# Altium footprint library Integrated Circuits.PcbLib: 142 footprints (part 8 of 9)
Each footprint in its own frame and in the unit in brackets; x right, y up, seen from the top. Pads: shape width x height; smd on the part's side, far side on the other; paste and mask are expansions set on the pad; w line width, h text height; cw(c..) or ccw(c..) is an arc to the next point about the centre after c.
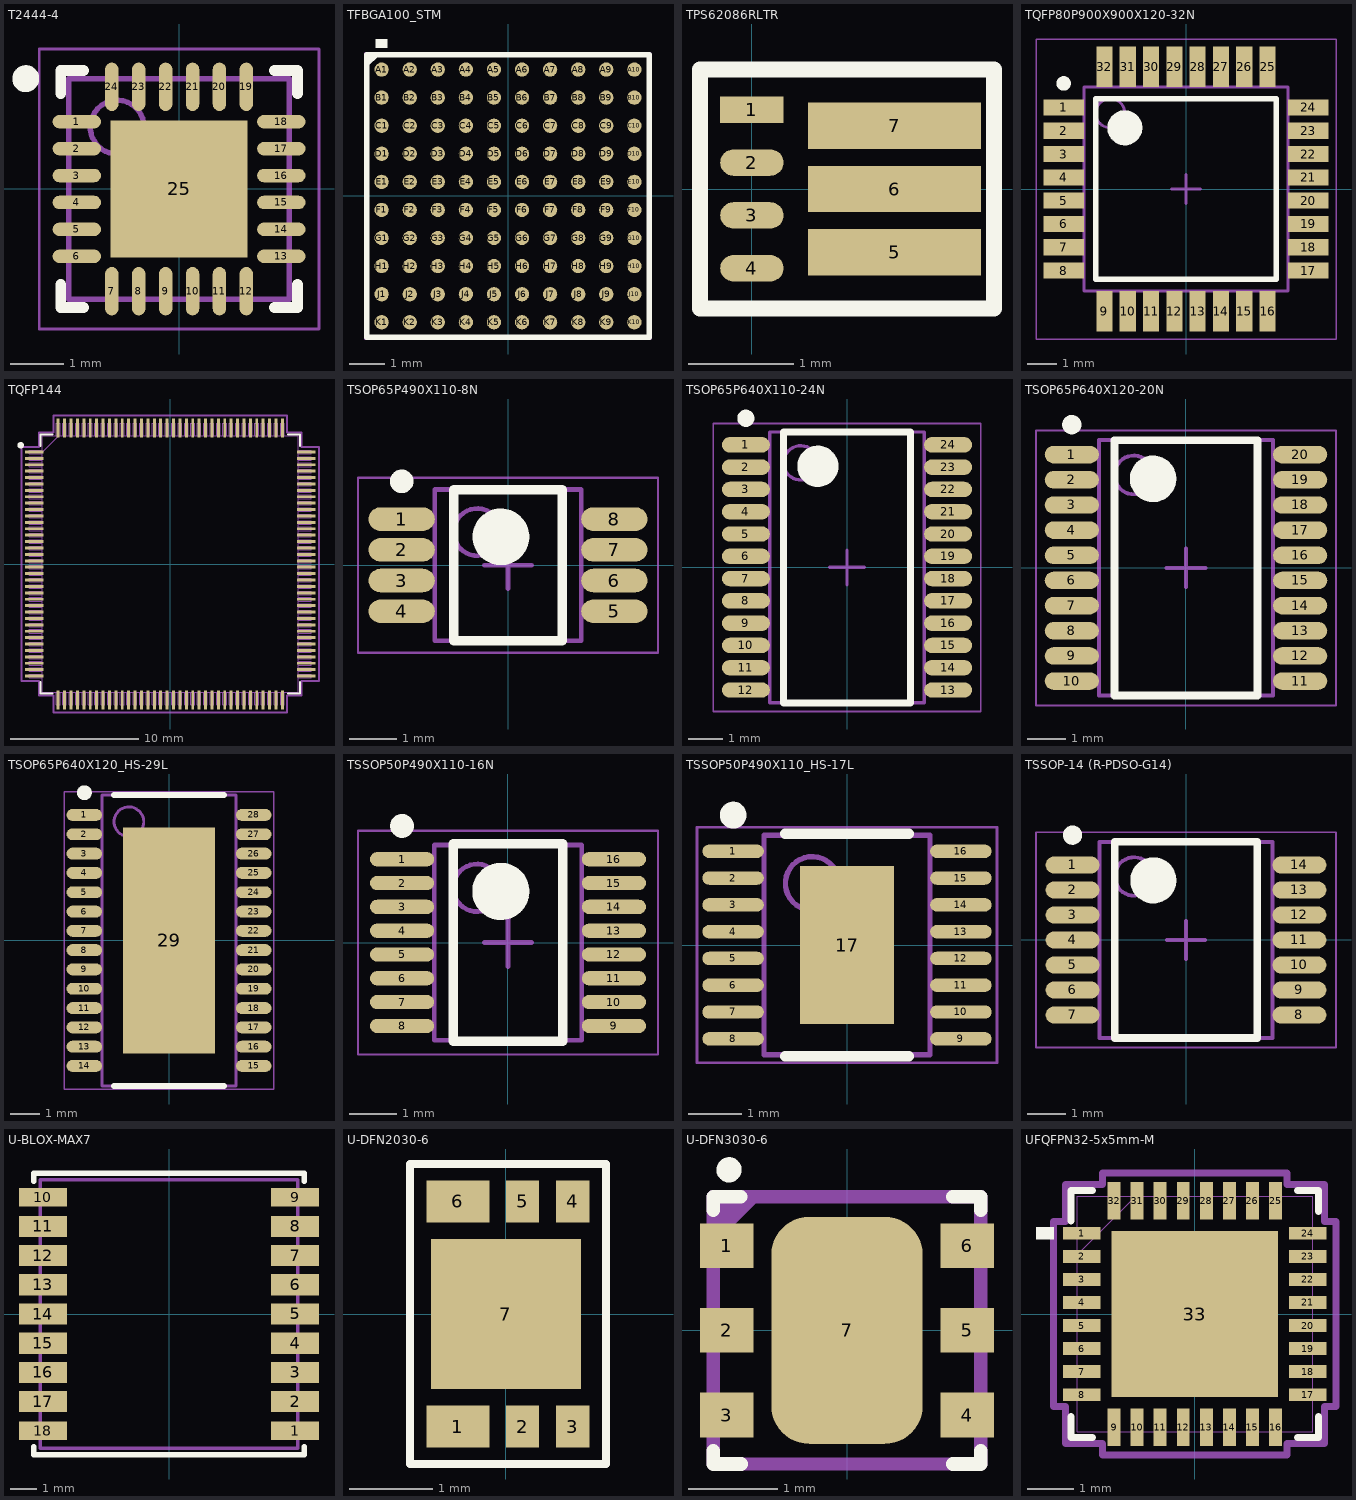
[diagram p7: the footprints below, top view; thin cyan lines are the x and y axes]

## T2444-4 [mm] "QFN, 24-Leads, Body 4.00x4.00mm, Pitch 0.50mm, Thermal Pad 2.54x2.54mm, IPC Medium Density"
height 0.8
pads (25):
  oval 0.9x0.25 smd mask+0.1: 1(-1.9,1.25) 2(-1.9,0.75) 3(-1.9,0.25) 4(-1.9,-0.25) 5(-1.9,-0.75) 6(-1.9,-1.25) 13(1.9,-1.25) 14(1.9,-0.75) 15(1.9,-0.25) 16(1.9,0.25) 17(1.9,0.75) 18(1.9,1.25)
  oval 0.25x0.9 smd mask+0.1: 7(-1.25,-1.9) 8(-0.75,-1.9) 9(-0.25,-1.9) 10(0.25,-1.9) 11(0.75,-1.9) 12(1.25,-1.9) 19(1.25,1.9) 20(0.75,1.9) 21(0.25,1.9) 22(-0.25,1.9) 23(-0.75,1.9) 24(-1.25,1.9)
  rect 2.54x2.54 smd mask+0.1: 25(0,0)
Top Overlay:
  circle w0.25: c-2.85,2.05 r0.125
  lines w0.2: -2.2,-1.775 -2.2,-2.2 -1.775,-2.2 ; -2.2,1.775 -2.2,2.2 -1.775,2.2 ; 1.775,-2.2 2.2,-2.2 2.2,-1.775 ; 1.775,2.2 2.2,2.2 2.2,1.775
3D Bodies:
  circle w0.1: c-1.15,1.15 r0.5
  lines w0.1: -2.05,-2.05 2.05,-2.05 2.05,2.05 -2.05,2.05 -2.05,-2.05
Mechanical 15:
  lines w0.05: -2.6,-2.6 2.6,-2.6 2.6,2.6 -2.6,2.6 -2.6,-2.6
  lines w0.1: -0.5,0 0.5,0 ; 0,-0.5 0,0.5
3D body "T2444-4.step": height 0.8, standoff 0, extent -2.051,-2.051 2.051,2.051

## TFBGA100_STM [mm]
pads (100):
  round 0.406 smd paste+0 mask+0.076: A1(-3.6,3.6) A2(-2.8,3.6) A3(-2,3.6) A4(-1.2,3.6) A5(-0.4,3.6) A6(0.4,3.6) A7(1.2,3.6) A8(2,3.6) A9(2.8,3.6) A10(3.6,3.6) B1(-3.6,2.8) B2(-2.8,2.8) B3(-2,2.8) B4(-1.2,2.8) B5(-0.4,2.8) B6(0.4,2.8) B7(1.2,2.8) B8(2,2.8) B9(2.8,2.8) B10(3.6,2.8) C1(-3.6,2) C2(-2.8,2) C3(-2,2) C4(-1.2,2) C5(-0.4,2) C6(0.4,2) C7(1.2,2) C8(2,2) C9(2.8,2) C10(3.6,2) D1(-3.6,1.2) D2(-2.8,1.2) D3(-2,1.2) D4(-1.2,1.2) D5(-0.4,1.2) D6(0.4,1.2) D7(1.2,1.2) D8(2,1.2) D9(2.8,1.2) D10(3.6,1.2) E1(-3.6,0.4) E2(-2.8,0.4) E3(-2,0.4) E4(-1.2,0.4) E5(-0.4,0.4) E6(0.4,0.4) E7(1.2,0.4) E8(2,0.4) E9(2.8,0.4) E10(3.6,0.4) F1(-3.6,-0.4) F2(-2.8,-0.4) F3(-2,-0.4) F4(-1.2,-0.4) F5(-0.4,-0.4) F6(0.4,-0.4) F7(1.2,-0.4) F8(2,-0.4) F9(2.8,-0.4) F10(3.6,-0.4) G1(-3.6,-1.2) G2(-2.8,-1.2) G3(-2,-1.2) G4(-1.2,-1.2) G5(-0.4,-1.2) G6(0.4,-1.2) G7(1.2,-1.2) G8(2,-1.2) G9(2.8,-1.2) G10(3.6,-1.2) H1(-3.6,-2) H2(-2.8,-2) H3(-2,-2) H4(-1.2,-2) H5(-0.4,-2) H6(0.4,-2) H7(1.2,-2) H8(2,-2) H9(2.8,-2) H10(3.6,-2) J1(-3.6,-2.8) J2(-2.8,-2.8) J3(-2,-2.8) J4(-1.2,-2.8) J5(-0.4,-2.8) J6(0.4,-2.8) J7(1.2,-2.8) J8(2,-2.8) J9(2.8,-2.8) J10(3.6,-2.8) K1(-3.6,-3.6) K2(-2.8,-3.6) K3(-2,-3.6) K4(-1.2,-3.6) K5(-0.4,-3.6) K6(0.4,-3.6) K7(1.2,-3.6) K8(2,-3.6) K9(2.8,-3.6) K10(3.6,-3.6)
Top Overlay:
  region: -3.435,4.47 -3.435,4.216 -3.765,4.216 -3.765,4.47
  region: -4.025,4.025 -4.025,3.659 -3.659,4.025
  lines w0.152: -4.025,-4.025 4.025,-4.025 4.025,4.025 -4.025,4.025 -4.025,-4.025
Top Assembly:
  lines w0.025: -4.077,3.677 -3.677,4.077 ; -4.077,-4.077 4.077,-4.077 4.077,4.077 -4.077,4.077 -4.077,-4.077
  text "A" at -5.347,2.965 h1.27
  text "K" at -5.347,-4.235 h1.27
  text "1" at -2.965,4.712 h1.27
  text "10" at 4.235,4.712 h1.27
3D body "TFBGA100_STM v1.step": height 1.09, standoff 0, extent -4.077,-4.077 4.077,4.077

## TPS62086RLTR [mm] "QFN, 16-Leads, Body 3.00x3.00mm, Pitch 0.50mm, Thermal Pad 1.68x1.68mm, IPC Medium Density"
height 1
pads (7):
  rect 0.6x0.25 smd mask+0.07: 1(0,0.75)
  oval 0.6x0.25 smd mask+0.07: 2(0,0.25) 3(0,-0.25) 4(0,-0.75)
  rect 1.64x0.44 smd mask-0.07: 5(1.35,-0.6) 6(1.35,0) 7(1.35,0.6)
Top Overlay:
  lines w0.15: -0.49,-1.13 2.29,-1.13 2.29,1.13 -0.49,1.13 -0.49,-1.13

## TQFP80P900X900X120-32N [mm] "TQFP, 32-Leads, Body 7.00x7.00mm, Pitch 0.80mm, IPC Medium Density"
height 1.2
pads (32):
  rect 1.4x0.55 smd: 1(-4.2,2.8) 2(-4.2,2) 3(-4.2,1.2) 4(-4.2,0.4) 5(-4.2,-0.4) 6(-4.2,-1.2) 7(-4.2,-2) 8(-4.2,-2.8) 17(4.2,-2.8) 18(4.2,-2) 19(4.2,-1.2) 20(4.2,-0.4) 21(4.2,0.4) 22(4.2,1.2) 23(4.2,2) 24(4.2,2.8)
  rect 0.55x1.4 smd: 9(-2.8,-4.2) 10(-2,-4.2) 11(-1.2,-4.2) 12(-0.4,-4.2) 13(0.4,-4.2) 14(1.2,-4.2) 15(2,-4.2) 16(2.8,-4.2) 25(2.8,4.2) 26(2,4.2) 27(1.2,4.2) 28(0.4,4.2) 29(-0.4,4.2) 30(-1.2,4.2) 31(-2,4.2) 32(-2.8,4.2)
Top Overlay:
  circle w0.6: c-2.1,2.1 r0.3
  circle w0.25: c-4.2,3.625 r0.125
  lines w0.2: -3.1,-3.1 3.1,-3.1 3.1,3.1 -3.1,3.1 -3.1,-3.1
Top Courtyard:
  lines w0.05: -5.15,-5.15 5.15,-5.15 5.15,5.15 -5.15,5.15 -5.15,-5.15
  lines w0.1: -0.5,0 0.5,0 ; 0,-0.5 0,0.5
Top Assembly:
  circle w0.1: c-2.6,2.6 r0.5
  lines w0.1: -3.5,-3.5 3.5,-3.5 3.5,3.5 -3.5,3.5 -3.5,-3.5
3D body "PCM2912A TQFP-32 v1.step": height 1.1, standoff 0, extent -4.5,-4.5 4.5,4.5

## TQFP144 [mil] "LatticeMXO2 TQFP144"
pads (144):
  rect 58x9 smd paste+0: 1(-418,344.49) 2(-418,324.8) 3(-418,305.12) 4(-418,285.43) 5(-418,265.75) 6(-418,246.06) 7(-418,226.38) 8(-418,206.69) 9(-418,187.01) 10(-418,167.32) 11(-418,147.64) 12(-418,127.95) 13(-418,108.27) 14(-418,88.58) 15(-418,68.9) 16(-418,49.21) 17(-418,29.53) 18(-418,9.84) 19(-418,-9.84) 20(-418,-29.53) 21(-418,-49.21) 22(-418,-68.9) 23(-418,-88.58) 24(-418,-108.27) 25(-418,-127.95) 26(-418,-147.64) 27(-418,-167.32) 28(-418,-187.01) 29(-418,-206.69) 30(-418,-226.38) 31(-418,-246.06) 32(-418,-265.75) 33(-418,-285.43) 34(-418,-305.12) 35(-418,-324.8) 36(-418,-344.49) 73(418,-344.49) 74(418,-324.8) 75(418,-305.12) 76(418,-285.43) 77(418,-265.75) 78(418,-246.06) 79(418,-226.38) 80(418,-206.69) 81(418,-187.01) 82(418,-167.32) 83(418,-147.64) 84(418,-127.95) 85(418,-108.27) 86(418,-88.58) 87(418,-68.9) 88(418,-49.21) 89(418,-29.53) 90(418,-9.84) 91(418,9.84) 92(418,29.53) 93(418,49.21) 94(418,68.9) 95(418,88.58) 96(418,108.27) 97(418,127.95) 98(418,147.64) 99(418,167.32) 100(418,187.01) 101(418,206.69) 102(418,226.38) 103(418,246.06) 104(418,265.75) 105(418,285.43) 106(418,305.12) 107(418,324.8) 108(418,344.49)
  rect 9x58 smd paste+0: 37(-344.49,-418) 38(-324.8,-418) 39(-305.12,-418) 40(-285.43,-418) 41(-265.75,-418) 42(-246.06,-418) 43(-226.38,-418) 44(-206.69,-418) 45(-187.01,-418) 46(-167.32,-418) 47(-147.64,-418) 48(-127.95,-418) 49(-108.27,-418) 50(-88.58,-418) 51(-68.9,-418) 52(-49.21,-418) 53(-29.53,-418) 54(-9.84,-418) 55(9.84,-418) 56(29.53,-418) 57(49.21,-418) 58(68.9,-418) 59(88.58,-418) 60(108.27,-418) 61(127.95,-418) 62(147.64,-418) 63(167.32,-418) 64(187.01,-418) 65(206.69,-418) 66(226.38,-418) 67(246.06,-418) 68(265.75,-418) 69(285.43,-418) 70(305.12,-418) 71(324.8,-418) 72(344.49,-418) 109(344.49,418) 110(324.8,418) 111(305.12,418) 112(285.43,418) 113(265.75,418) 114(246.06,418) 115(226.38,418) 116(206.69,418) 117(187.01,418) 118(167.32,418) 119(147.64,418) 120(127.95,418) 121(108.27,418) 122(88.58,418) 123(68.9,418) 124(49.21,418) 125(29.53,418) 126(9.84,418) 127(-9.84,418) 128(-29.53,418) 129(-49.21,418) 130(-68.9,418) 131(-88.58,418) 132(-108.27,418) 133(-127.95,418) 134(-147.64,418) 135(-167.32,418) 136(-187.01,418) 137(-206.69,418) 138(-226.38,418) 139(-246.06,418) 140(-265.75,418) 141(-285.43,418) 142(-305.12,418) 143(-324.8,418) 144(-344.49,418)
Top Overlay:
  circle w10: c-460,365 r5
  lines w6: -398.5,-362.09 -398.5,-398.5 -362.09,-398.5 ; -398.5,362.09 -398.5,398.5 -362.09,398.5 ; 362.09,-398.5 398.5,-398.5 398.5,-362.09 ; 362.09,398.5 398.5,398.5 398.5,362.09
3D Bodies:
  drawing of 581 lines, arcs and shapes, not listed
  text "*" at -391,329.33 h50
Mechanical 15:
  lines w6: -457,-358.99 -457,358.99 -403.5,358.99 -403.5,403.5 -358.99,403.5 -358.99,457 358.99,457 358.99,403.5 403.5,403.5 403.5,358.99 457,358.99 457,-358.99 403.5,-358.99 403.5,-403.5 358.99,-403.5 358.99,-457 -358.99,-457 -358.99,-403.5 -403.5,-403.5 -403.5,-358.99 -457,-358.99
3D body "QFP50P2200X2200X160-144N LQFP-144.stp": height 63.49, standoff 0.5, extent -433.07,-433.08 433.08,433.07

## TSOP65P490X110-8N [mm] "TSSOP8 (MSOP8), 8-Leads, Body 3.00x2.95mm, Pitch 0.65mm, IPC Medium Density"
height 1.1
pads (8):
  oval 1.4x0.5 smd: 1(-2.25,0.975) 2(-2.25,0.325) 3(-2.25,-0.325) 4(-2.25,-0.975) 5(2.25,-0.975) 6(2.25,-0.325) 7(2.25,0.325) 8(2.25,0.975)
Top Overlay:
  circle w0.6: c-0.15,0.6 r0.3
  circle w0.25: c-2.25,1.775 r0.125
  lines w0.2: -1.15,-1.6 1.15,-1.6 1.15,1.6 -1.15,1.6 -1.15,-1.6
3D Bodies:
  circle w0.1: c-0.65,0.7 r0.5
  lines w0.1: -1.55,-1.6 1.55,-1.6 1.55,1.6 -1.55,1.6 -1.55,-1.6
Mechanical 15:
  lines w0.05: -3.175,-1.85 3.175,-1.85 3.175,1.85 -3.175,1.85 -3.175,-1.85
  lines w0.1: -0.5,0 0.5,0 ; 0,-0.5 0,0.5
3D body: height 1.1, standoff 0, extent -1.55,-1.6 1.55,1.6

## TSOP65P640X110-24N [mm] "TSOP, 24-Leads, Body 7.80x4.40mm, Pitch 0.65mm, IPC Medium Density"
height 1.1
pads (24):
  oval 1.4x0.45 smd: 1(-2.95,3.575) 2(-2.95,2.925) 3(-2.95,2.275) 4(-2.95,1.625) 5(-2.95,0.975) 6(-2.95,0.325) 7(-2.95,-0.325) 8(-2.95,-0.975) 9(-2.95,-1.625) 10(-2.95,-2.275) 11(-2.95,-2.925) 12(-2.95,-3.575) 13(2.95,-3.575) 14(2.95,-2.925) 15(2.95,-2.275) 16(2.95,-1.625) 17(2.95,-0.975) 18(2.95,-0.325) 19(2.95,0.325) 20(2.95,0.975) 21(2.95,1.625) 22(2.95,2.275) 23(2.95,2.925) 24(2.95,3.575)
Top Overlay:
  circle w0.6: c-0.85,2.95 r0.3
  circle w0.25: c-2.95,4.35 r0.125
  lines w0.2: -1.85,-3.95 1.85,-3.95 1.85,3.95 -1.85,3.95 -1.85,-3.95
3D Bodies:
  circle w0.1: c-1.35,3.05 r0.5
  lines w0.1: -2.25,-3.95 2.25,-3.95 2.25,3.95 -2.25,3.95 -2.25,-3.95
Mechanical 15:
  lines w0.05: -3.9,-4.2 3.9,-4.2 3.9,4.2 -3.9,4.2 -3.9,-4.2
  lines w0.1: -0.5,0 0.5,0 ; 0,-0.5 0,0.5
3D body: height 1.1, standoff 0.05, extent -2.25,-3.95 2.25,3.95

## TSOP65P640X120-20N [mm] "TSOP, 20-Leads, Body 6.50x4.40mm, Pitch 0.65mm, IPC Medium Density"
height 1.2
pads (20):
  oval 1.4x0.45 smd: 1(-2.95,2.925) 2(-2.95,2.275) 3(-2.95,1.625) 4(-2.95,0.975) 5(-2.95,0.325) 6(-2.95,-0.325) 7(-2.95,-0.975) 8(-2.95,-1.625) 9(-2.95,-2.275) 10(-2.95,-2.925) 11(2.95,-2.925) 12(2.95,-2.275) 13(2.95,-1.625) 14(2.95,-0.975) 15(2.95,-0.325) 16(2.95,0.325) 17(2.95,0.975) 18(2.95,1.625) 19(2.95,2.275) 20(2.95,2.925)
Top Overlay:
  circle w0.25: c-2.95,3.7 r0.125
  circle w0.6: c-0.85,2.3 r0.3
  lines w0.2: -1.85,-3.3 -1.85,3.3 1.85,3.3 1.85,-3.3 -1.85,-3.3
3D Bodies:
  circle w0.1: c-1.35,2.4 r0.5
  lines w0.1: -2.25,-3.3 -2.25,3.3 2.25,3.3 2.25,-3.3 -2.25,-3.3
Mechanical 15:
  lines w0.05: -3.875,-3.55 -3.875,3.55 3.875,3.55 3.875,-3.55 -3.875,-3.55
  lines w0.1: -0.5,0 0.5,0 ; 0,-0.5 0,0.5
3D body "!1_@_0 _ TSSOP-20.stp": height 1.3, standoff -0.02, extent -3.208,-3.274 3.208,3.226

## TSOP65P640X120_HS-29L [mm] "TSOP, 28-Leads, Body 9.70x4.40mm, Pitch 0.65mm, Thermal Pad 7.60x3.10mm, IPC High Density"
height 1.2
pads (29):
  oval 1.2x0.4 smd: 1(-2.85,4.225) 2(-2.85,3.575) 3(-2.85,2.925) 4(-2.85,2.275) 5(-2.85,1.625) 6(-2.85,0.975) 7(-2.85,0.325) 8(-2.85,-0.325) 9(-2.85,-0.975) 10(-2.85,-1.625) 11(-2.85,-2.275) 12(-2.85,-2.925) 13(-2.85,-3.575) 14(-2.85,-4.225) 15(2.85,-4.225) 16(2.85,-3.575) 17(2.85,-2.925) 18(2.85,-2.275) 19(2.85,-1.625) 20(2.85,-0.975) 21(2.85,-0.325) 22(2.85,0.325) 23(2.85,0.975) 24(2.85,1.625) 25(2.85,2.275) 26(2.85,2.925) 27(2.85,3.575) 28(2.85,4.225)
  rect 3.1x7.6 smd: 29(0,0)
Top Overlay:
  circle w0.25: c-2.85,4.975 r0.125
  lines w0.2: -1.85,-4.9 1.85,-4.9 ; -1.85,4.9 1.85,4.9
3D Bodies:
  circle w0.1: c-1.35,4 r0.5
  lines w0.1: -2.25,-4.9 2.25,-4.9 2.25,4.9 -2.25,4.9 -2.25,-4.9
Mechanical 15:
  lines w0.05: -3.525,-5 3.525,-5 3.525,5 -3.525,5 -3.525,-5
  lines w0.1: -0.5,0 0.5,0 ; 0,-0.5 0,0.5
3D body "TSOP65P640X120_HS-29L.step": height 1.2, standoff 0, extent -3.2,-4.9 3.2,4.9

## TSSOP50P490X110-16N [mm] "TSSOP, 16-Leads, Body 4.04x3.00mm, Pitch 0.50mm, IPC Medium Density"
height 1.1
pads (16):
  oval 1.35x0.3 smd: 1(-2.225,1.75) 2(-2.225,1.25) 3(-2.225,0.75) 4(-2.225,0.25) 5(-2.225,-0.25) 6(-2.225,-0.75) 7(-2.225,-1.25) 8(-2.225,-1.75) 9(2.225,-1.75) 10(2.225,-1.25) 11(2.225,-0.75) 12(2.225,-0.25) 13(2.225,0.25) 14(2.225,0.75) 15(2.225,1.25) 16(2.225,1.75)
Top Overlay:
  circle w0.6: c-0.15,1.075 r0.3
  circle w0.25: c-2.225,2.45 r0.125
  lines w0.2: -1.15,-2.075 1.15,-2.075 1.15,2.075 -1.15,2.075 -1.15,-2.075
3D Bodies:
  circle w0.1: c-0.65,1.15 r0.5
  lines w0.1: -1.55,-2.05 1.55,-2.05 1.55,2.05 -1.55,2.05 -1.55,-2.05
Mechanical 15:
  lines w0.05: -3.15,-2.35 3.15,-2.35 3.15,2.35 -3.15,2.35 -3.15,-2.35
  lines w0.1: -0.5,0 0.5,0 ; 0,-0.5 0,0.5
3D body "TSSOP50P490X110-16N.step": height 1.1, standoff 0, extent -2.45,-2.05 2.45,2.05

## TSSOP50P490X110_HS-17L [mm] "TSSOP, 16-Leads, Body 4.04x3.00mm, Pitch 0.50mm, Thermal Pad 2.95x1.76mm, IPC High Density"
height 1.1
pads (17):
  oval 1.15x0.25 smd: 1(-2.125,1.75) 2(-2.125,1.25) 3(-2.125,0.75) 4(-2.125,0.25) 5(-2.125,-0.25) 6(-2.125,-0.75) 7(-2.125,-1.25) 8(-2.125,-1.75) 9(2.125,-1.75) 10(2.125,-1.25) 11(2.125,-0.75) 12(2.125,-0.25) 13(2.125,0.25) 14(2.125,0.75) 15(2.125,1.25) 16(2.125,1.75)
  rect 1.76x2.95 smd: 17(0,0)
Top Overlay:
  circle w0.25: c-2.125,2.425 r0.125
  lines w0.2: -1.15,-2.075 1.15,-2.075 ; -1.15,2.075 1.15,2.075
3D Bodies:
  circle w0.1: c-0.65,1.15 r0.5
  lines w0.1: -1.55,-2.05 -1.55,2.05 1.55,2.05 1.55,-2.05 -1.55,-2.05
Mechanical 15:
  lines w0.05: -2.8,-2.2 -2.8,2.2 2.8,2.2 2.8,-2.2 -2.8,-2.2
  lines w0.1: -0.5,0 0.5,0 ; 0,-0.5 0,0.5
3D body "TSSOP50P490X110_HS-17L.step": height 1.1, standoff 0, extent -2.45,-2.05 2.45,2.05

## TSSOP-14 (R-PDSO-G14) [mm] "TSSOP, 14-Leads, Body 5.00x4.40mm, Pitch 0.65mm, IPC Medium Density"
height 1.2
pads (14):
  oval 1.4x0.45 smd: 1(-2.95,1.95) 2(-2.95,1.3) 3(-2.95,0.65) 4(-2.95,0) 5(-2.95,-0.65) 6(-2.95,-1.3) 7(-2.95,-1.95) 8(2.95,-1.95) 9(2.95,-1.3) 10(2.95,-0.65) 11(2.95,0) 12(2.95,0.65) 13(2.95,1.3) 14(2.95,1.95)
Top Overlay:
  circle w0.6: c-0.85,1.55 r0.3
  circle w0.25: c-2.95,2.725 r0.125
  lines w0.2: -1.85,-2.55 1.85,-2.55 1.85,2.55 -1.85,2.55 -1.85,-2.55
3D Bodies:
  circle w0.1: c-1.35,1.65 r0.5
  lines w0.1: -2.25,-2.55 2.25,-2.55 2.25,2.55 -2.25,2.55 -2.25,-2.55
Mechanical 15:
  lines w0.05: -3.9,-2.8 3.9,-2.8 3.9,2.8 -3.9,2.8 -3.9,-2.8
  lines w0.1: -0.5,0 0.5,0 ; 0,-0.5 0,0.5
3D body: height 1.2, standoff 0.05, extent -2.25,-2.55 2.25,2.55

## U-BLOX-MAX7 [mm]
pads (18):
  rect 1.8x0.7 smd mask+0.102: 1(4.75,-4.4)
  rect 1.8x0.8 smd: 2(4.75,-3.3) 3(4.75,-2.2) 4(4.75,-1.1) 5(4.75,0) 6(4.75,1.1) 7(4.75,2.2) 8(4.75,3.3) 11(-4.75,3.3) 12(-4.75,2.2) 13(-4.75,1.1) 14(-4.75,0) 15(-4.75,-1.1) 16(-4.75,-2.2) 17(-4.75,-3.3)
  rect 1.8x0.7 smd: 9(4.75,4.4) 10(-4.75,4.4) 18(-4.75,-4.4)
Top Overlay:
  lines w0.203: -5.1,-5 -5.1,-5.3 5.1,-5.3 5.1,-5 ; -5.1,5 -5.1,5.3 5.1,5.3 5.1,5
Top Assy Drawing:
  circle w0.25: c4.175,-4.4 r0.125
  lines w0.127: -4.85,-5.05 -4.85,5.05 4.85,5.05 4.85,-5.05 -4.85,-5.05
  text ".Designator" at -0.6,3.9 h0.76
3D body: height 2.7, standoff 0, extent -4.849,-5.049 4.849,5.049

## U-DFN2030-6 [mm]
height 0.6
pads (7):
  rect 0.75x0.5 smd: 1(-0.575,-1.35) 6(-0.575,1.35)
  rect 0.4x0.5 smd: 2(0.2,-1.35) 3(0.8,-1.35) 4(0.8,1.35) 5(0.2,1.35)
  rect 1.8x1.8 smd: 7(0,0)
Top Overlay:
  lines w0.1: -1.15,-1.8 1.2,-1.8 1.2,1.8 -1.15,1.8 -1.15,-1.8
3D body: height 0.6, standoff 0, extent -1.05,-1.7 1.1,1.7

## U-DFN3030-6 [mm] "Diodes Inc DFN3030 6 Pin EP"
height 0.8
pads (7):
  rect 0.6x0.5 smd mask+0.06: 1(-1.35,0.95) 2(-1.35,0) 3(-1.35,-0.95) 4(1.35,-0.95) 5(1.35,0) 6(1.35,0.95)
  rrect50% 1.7x2.55 smd mask+0: 7(0,0)
Top Overlay:
  lines w0.152: -1.503,1.351 -1.503,1.501 -1.192,1.501 ; -1.5,-1.35 -1.5,-1.5 -1.189,-1.5 ; -1.26,1.813 ccw(c-1.324,1.802) -1.259,1.799 ; 1.189,-1.5 1.5,-1.5 1.5,-1.35 ; 1.189,1.5 1.5,1.5 1.5,1.35
Top Paste:
  region: 0.4,0.7 0.05,0.7 0.05,0.05 0.4,0.05
  region: -0.4,-0.7 -0.05,-0.7 -0.05,-0.05 -0.4,-0.05
  region: 0.4,-0.7 0.05,-0.7 0.05,-0.05 0.4,-0.05
  region: -0.4,0.7 -0.05,0.7 -0.05,0.05 -0.4,0.05
Top Assy Drawing:
  region: -1.503,0.95 -0.952,1.501 -1.503,1.501
  lines w0.1: -0.5,0 0.5,0 ; 0,-0.5 0,0.5
  lines w0.15: -1.5,-1.5 1.5,-1.5 1.5,1.5 -1.5,1.5 -1.5,-1.5
  text ".Designator" at -1.956,-0.279 h0.38
3D body "AL8862FF-7 v2.step": height 0.6, standoff 0, extent -1.5,-1.5 1.5,1.5

## UFQFPN32-5x5mm-M [mil]
pads (33):
  rect 32x11 smd paste-16 mask-16: 1(-96.5,68.9) 2(-96.5,49.21) 3(-96.5,29.53) 4(-96.5,9.84) 5(-96.5,-9.84) 6(-96.5,-29.53) 7(-96.5,-49.21) 8(-96.5,-68.9) 17(96.5,-68.9) 18(96.5,-49.21) 19(96.5,-29.53) 20(96.5,-9.84) 21(96.5,9.84) 22(96.5,29.53) 23(96.5,49.21) 24(96.5,68.9)
  rect 11x32 smd paste-16 mask-16: 9(-68.9,-96.5) 10(-49.21,-96.5) 11(-29.53,-96.5) 12(-9.84,-96.5) 13(9.84,-96.5) 14(29.53,-96.5) 15(49.21,-96.5) 16(68.9,-96.5) 25(68.9,96.5) 26(49.21,96.5) 27(29.53,96.5) 28(9.84,96.5) 29(-9.84,96.5) 30(-29.53,96.5) 31(-49.21,96.5) 32(-68.9,96.5)
  rect 142x142 smd paste-70.5 mask-71: 33(0,0)
Top Overlay:
  region: -120.5,63.9 -135.5,63.9 -135.5,73.9 -120.5,73.9
  lines w6: -105.5,-87.5 -105.5,-105.5 -87.5,-105.5 ; -105.5,79.4 -105.5,105.5 -87.5,105.5 ; 87.5,-105.5 105.5,-105.5 105.5,-87.5 ; 87.5,105.5 105.5,105.5 105.5,87.5
Top Paste:
  region: 67.06,-3.94 3.94,-3.94 3.94,-67.06 67.06,-67.06
  region: 67.06,67.06 3.94,67.06 3.94,3.94 67.06,3.94
  region: -3.94,-3.94 -67.06,-3.94 -67.06,-67.06 -3.94,-67.06
  region: -3.94,67.06 -67.06,67.06 -67.06,3.94 -3.94,3.94
Top Assembly:
  lines w6: -120.5,-78.74 -120.5,78.74 -110.5,78.74 -110.5,110.5 -78.74,110.5 -78.74,120.5 78.74,120.5 78.74,110.5 110.5,110.5 110.5,78.74 120.5,78.74 120.5,-78.74 110.5,-78.74 110.5,-110.5 78.74,-110.5 78.74,-120.5 -78.74,-120.5 -78.74,-110.5 -110.5,-110.5 -110.5,-78.74 -120.5,-78.74
3D Bodies:
  lines w1: -100.5,50.5 -50.5,100.5 ; -100.5,-100.5 -100.5,100.5 100.5,100.5 100.5,-100.5 -100.5,-100.5 ; -100.5,-74.4 -100.5,-63.4 -100.5,-74.4 ; -100.5,-54.71 -100.5,-43.71 -100.5,-54.71 ; -100.5,-35.03 -100.5,-24.03 -100.5,-35.03 ; -100.5,-15.34 -100.5,-4.34 -100.5,-15.34 ; -100.5,4.34 -100.5,15.34 -100.5,4.34 ; -100.5,24.03 -100.5,35.03 -100.5,24.03 ; -100.5,43.71 -100.5,54.71 -100.5,43.71 ; -100.5,63.4 -100.5,74.4 -100.5,63.4 ; -74.4,-100.5 -63.4,-100.5 -74.4,-100.5 ; -74.4,100.5 -63.4,100.5 -74.4,100.5 ; -54.71,-100.5 -43.71,-100.5 -54.71,-100.5 ; -54.71,100.5 -43.71,100.5 -54.71,100.5 ; -35.03,-100.5 -24.03,-100.5 -35.03,-100.5 ; -35.03,100.5 -24.03,100.5 -35.03,100.5 ; -15.34,-100.5 -4.34,-100.5 -15.34,-100.5 ; -15.34,100.5 -4.34,100.5 -15.34,100.5 ; 4.34,-100.5 15.34,-100.5 4.34,-100.5 ; 4.34,100.5 15.34,100.5 4.34,100.5 ; 24.03,-100.5 35.03,-100.5 24.03,-100.5 ; 24.03,100.5 35.03,100.5 24.03,100.5 ; 43.71,-100.5 54.71,-100.5 43.71,-100.5 ; 43.71,100.5 54.71,100.5 43.71,100.5 ; 63.4,-100.5 74.4,-100.5 63.4,-100.5 ; 63.4,100.5 74.4,100.5 63.4,100.5 ; 100.5,-74.4 100.5,-63.4 100.5,-74.4 ; 100.5,-54.71 100.5,-43.71 100.5,-54.71 ; 100.5,-35.03 100.5,-24.03 100.5,-35.03 ; 100.5,-15.34 100.5,-4.34 100.5,-15.34 ; 100.5,4.34 100.5,15.34 100.5,4.34 ; 100.5,24.03 100.5,35.03 100.5,24.03 ; 100.5,43.71 100.5,54.71 100.5,43.71 ; 100.5,63.4 100.5,74.4 100.5,63.4
  text "*" at -93,53.74 h50
3D body "UFQFPN32-5x5mm.step": height 22.09, standoff 0, extent -102.52,-102.52 102.52,102.52